# Altium footprint library negm_library.PcbLib: 39 footprints (part 3 of 3)
Each footprint in its own frame and in the unit in brackets; x right, y up, seen from the top. Pads: shape width x height; smd on the part's side, far side on the other; paste and mask are expansions set on the pad; w line width, h text height; cw(c..) or ccw(c..) is an arc to the next point about the centre after c.
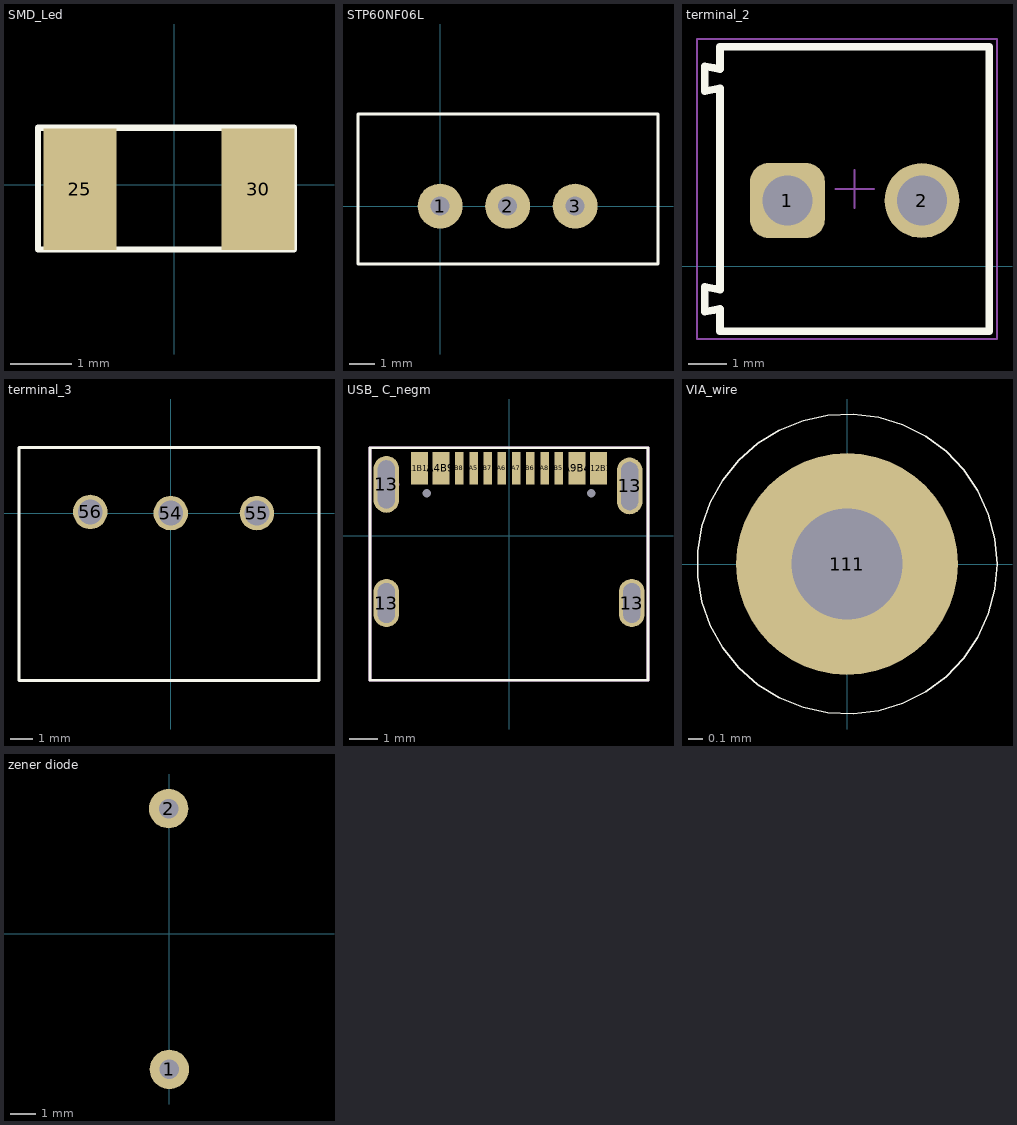
[diagram p2: the footprints below, top view; thin cyan lines are the x and y axes]

## SMD_Led [mm]
pads (2):
  rect 1.2x2 smd: 25(-1.549,-0.076) 30(1.372,-0.076)
Top Overlay:
  lines w0.1: -2.235,-1.067 1.965,-1.067 1.965,0.933 -2.235,0.933 -2.235,-1.067
3D body: height 0.25, standoff 0, extent -1.7,-0.625 1.7,0.625

## STP60NF06L [mm] "60V 60A 110W 14mΩ@10V,30A 1V@250uA 1 N-channel TO-220 MOSFETs ROHS"
pads (3):
  round 1.8 hole 0.762: 1(0,0) 2(2.7,0) 3(5.4,0)
Top Overlay:
  lines w0.125: -3.288,-2.317 8.712,-2.317 8.712,3.683 -3.288,3.683 -3.288,-2.317
3D body "sup60n06-18-e3.stp": height 22.62, standoff -8.37, extent -2.643,-1.638 8.027,3.192

## terminal_2 [mm]
pads (2):
  rrect50% 1.95x1.95 hole 1.3: 1(4.811,1.702)
  round 1.95 hole 1.3: 2(8.311,1.702)
Top Overlay:
  lines w0.2: 2.661,-1.193 2.661,-0.543 3.061,-0.618 3.061,4.622 2.661,4.547 2.661,5.197 3.061,5.122 3.061,5.702 10.061,5.702 10.061,-1.698 3.061,-1.698 3.061,-1.118 2.661,-1.193
Top 3D Body:
  lines w0.1: 2.661,-1.193 2.661,-0.543 3.061,-0.618 3.061,4.622 2.661,4.547 2.661,5.197 3.061,5.122 3.061,5.702 10.061,5.702 10.061,-1.698 3.061,-1.698 3.061,-1.118 2.661,-1.193
Top Designator:
  lines w0.05: 2.461,-1.898 2.461,5.902 10.261,5.902 10.261,-1.898 2.461,-1.898
Top Component Outline:
  lines w0.1: 2.661,-1.193 3.061,-1.118 3.061,-1.698 10.061,-1.698 10.061,5.702 3.061,5.702 3.061,5.122 2.661,5.197 2.661,4.547 3.061,4.622 3.061,-0.618 2.661,-0.543 2.661,-1.193
Bottom Courtyard:
  lines w0.05: 6.061,2.002 7.061,2.002 ; 6.561,1.502 6.561,2.502
3D body "691214110002.stp": height 8.55, standoff -3.65, extent 2.611,-1.698 10.061,5.703

## terminal_3 [mil] "1x3P 13.5A 200V Green 16~30 Direct Insert 3.81mm 1 3 Plugin,P=3.81mm Screw Terminal Blocks ROHS"
pads (3):
  round 60 hole 43.31: 54(0,0) 55(150,0) 56(-140,2)
Top Overlay:
  lines w4.92: -264,-291 258,-291 258,114 -264,114 -264,-291
3D body "terminal_blocks_a-tb381-th03.stp": height 401.57, standoff 0.04, extent -250.44,-277 244.44,100.95

## USB_ C_negm [mm]
pads (19):
  round 0 hole 0.3: 10(2.9,1.5) 11(-2.9,1.5)
  oval 0.9x1.7 hole 0.6 slot 1.4 at 90 deg mask+0.02: 13(-4.325,-2.375) 13(4.325,-2.375)
  oval 0.9x2 hole 0.6 slot 1.7 at 90 deg mask+0.02: 13(-4.325,1.805) 13(4.25,1.75) ""(4.25,1.75)
  rect 0.6x1.14 smd mask+0.02: A1B12(-3.15,2.375) A4B9(-2.4,2.375) A9B4(2.4,2.375) A12B1(3.15,2.375)
  rect 0.3x1.14 smd mask+0.02: A5(-1.25,2.375) A6(-0.25,2.375) A7(0.25,2.375) A8(1.25,2.375) B5(1.75,2.375) B6(0.75,2.375) B7(-0.75,2.375) B8(-1.75,2.375)
Top Overlay:
  lines w0.1: -4.9,-5.1 -4.9,3.1 4.9,3.1 4.9,-5.1 -4.9,-5.1
  text ".Designator" at -2,-1.633 h0.5
Mechanical 1:
  lines w0.254: -4.56,1.805 -3.99,1.805 ; 3.99,1.805 4.56,1.805
Mechanical29:
  lines w0.1: -4.9,-5.1 -4.9,3.1 4.9,3.1 4.9,-5.1 -4.9,-5.1
  text ".Designator" at -1.9,-1.533 h0.5
3D body "User Library-664121_1623983041_9594.step": height 0.69, standoff -3.57, extent -4.45,-4.85 4.49,2.9

## VIA_wire [mil]
pads (1):
  round 60 hole 30: 111(0,0)
Top Overlay:
  circle w0.39: c0,0 r40.58

## zener diode [mil]
pads (2):
  round 60 hole 30: 1(0,-206.69) 2(-1,191)
3D body "User Library-Silicone Diode 3_9x2_6.STEP": height 161.77, standoff 0.5, extent -51.19,-220 53.19,202.05